# Altium schematic symbol library SparkFun.SCHLIB: 796 symbols (part 4 of 5)
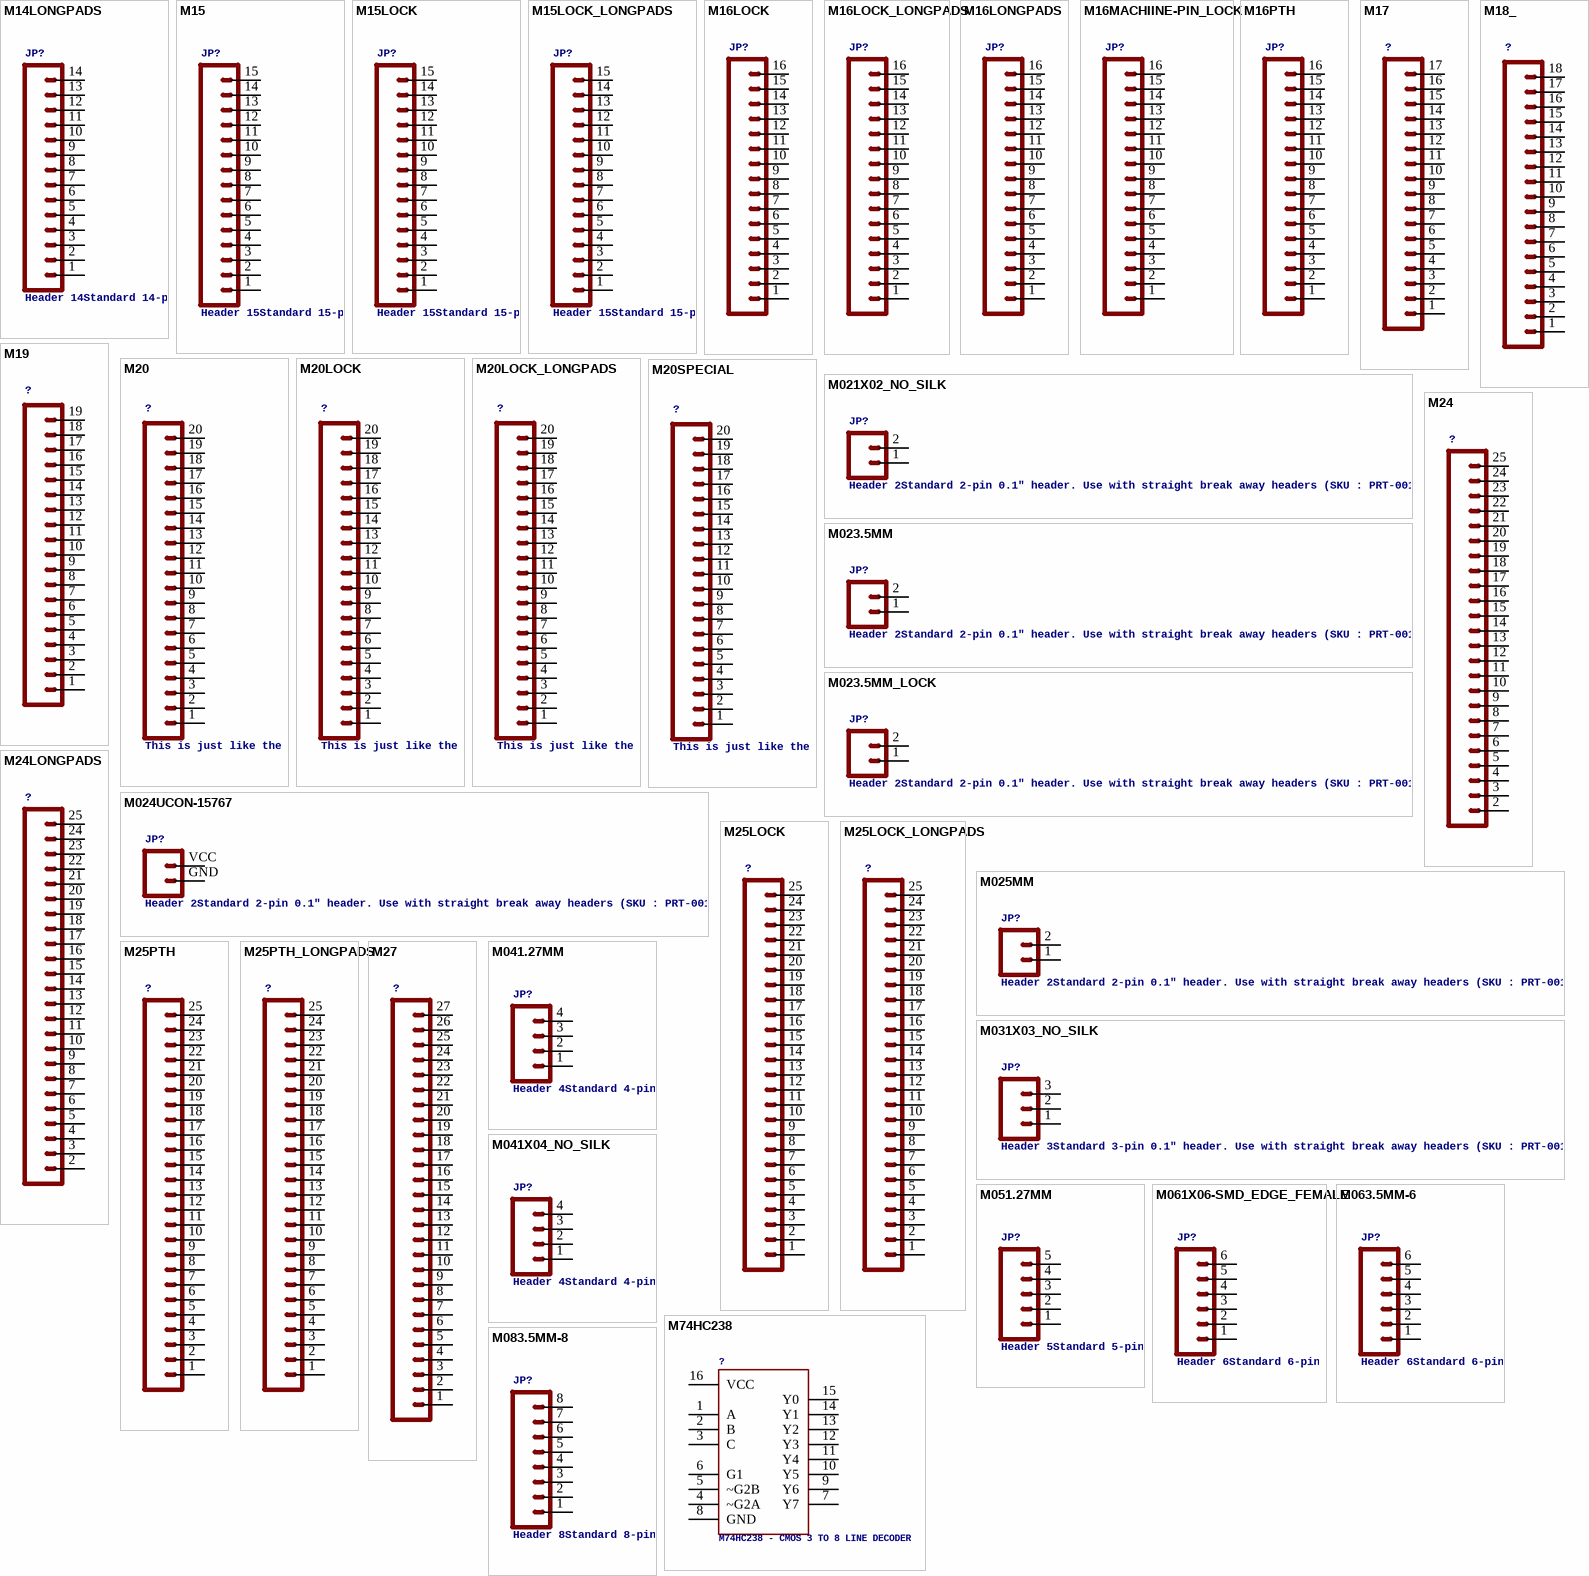
[diagram p39: symbols M14LONGPADS to M083.5MM-8]

## M025MM
designator JP?, comment Header 2Standard 2-pin 0.1" header. Use with straight break away headers (SKU : PRT-00116), right angle break away headers (PRT-00553), swiss pins (PRT-00743), machine pins (PRT-00117), and female headers (PRT-00115). Molex polarized connector foot print use with SKU : PRT-08233 with associated crimp pins and housings.
footprint SCREWTERMINAL-5MM-2
pins: 1, 2

## M25PTH
designator ?
footprint 1X25
pins: 1, 2, 3, 4, 5, 6, 7, 8, 9, 10, 11, 12, 13, 14, 15, 16, 17, 18, 19, 20, 21, 22, 23, 24, 25

## M25PTH_LONGPADS
designator ?
footprint 1X25_LONGPAD
pins: 1, 2, 3, 4, 5, 6, 7, 8, 9, 10, 11, 12, 13, 14, 15, 16, 17, 18, 19, 20, 21, 22, 23, 24, 25

## M27
designator ?
footprint 1X27
pins: 1, 2, 3, 4, 5, 6, 7, 8, 9, 10, 11, 12, 13, 14, 15, 16, 17, 18, 19, 20, 21, 22, 23, 24, 25, 26, 27

## M031X03_NO_SILK
designator JP?, comment Header 3Standard 3-pin 0.1" header. Use with straight break away headers (SKU : PRT-00116), right angle break away headers (PRT-00553), swiss pins (PRT-00743), machine pins (PRT-00117), and female headers (PRT-00115). Molex polarized connector foot print use with SKU : PRT-08232 with associated crimp pins and housings.
footprint 1X03_NO_SILK
pins: 1, 2, 3

## M041.27MM
designator JP?, comment Header 4Standard 4-pin 0.1" header. Use with straight break away headers (SKU : PRT-00116), right angle break away headers (PRT-00553), swiss pins (PRT-00743), machine pins (PRT-00117), and female headers (PRT-00115). Molex polarized connector foot print use with SKU : PRT-08231 with associated crimp pins and housings.
footprint 1X04-1.27MM
pins: 1, 2, 3, 4

## M041X04_NO_SILK
designator JP?, comment Header 4Standard 4-pin 0.1" header. Use with straight break away headers (SKU : PRT-00116), right angle break away headers (PRT-00553), swiss pins (PRT-00743), machine pins (PRT-00117), and female headers (PRT-00115). Molex polarized connector foot print use with SKU : PRT-08231 with associated crimp pins and housings.
footprint 1X04_NO_SILK
pins: 1, 2, 3, 4

## M051.27MM
designator JP?, comment Header 5Standard 5-pin 0.1" header. Use with straight break away headers (SKU : PRT-00116), right angle break away headers (PRT-00553), swiss pins (PRT-00743), machine pins (PRT-00117), and female headers (PRT-00115). Molex polarized connector foot print use with SKU : PRT-08230 with associated crimp pins and housings.
footprint 1X05-1.27MM
pins: 1, 2, 3, 4, 5

## M061X06-SMD_EDGE_FEMALE
designator JP?, comment Header 6Standard 6-pin 0.1" header. Use with straight break away headers (SKU : PRT-00116), right angle break away headers (PRT-00553), swiss pins (PRT-00743), machine pins (PRT-00117), and female headers (PRT-00115). Molex polarized connector foot print use with SKU : PRT-08094 with associated crimp pins and housings. NOTES ON THE VARIANTS LOCK and LOCK_LONGPADS... This footprint was designed to help hold the alignment of a through-hole component (i.e.  6-pin header) while soldering it into place. You may notice that each hole has been shifted either up or down by 0.005 of an inch from it's more standard position (which is a perfectly straight line). This slight alteration caused the pins (the squares in the middle) to touch the edges of the holes.  Because they are alternating, it causes a "brace" to hold the component in place.  0.005 has proven to be the perfect amount of "off-center" position when using our standard breakaway headers. Although looks a little odd when you look at the bare footprint, once you have a header in there, the alteration is very hard to notice.  Also, if you push a header all the way into place, it is covered up entirely on the bottom side.  This idea of altering the position of holes to aid alignment will be further integrated into the Sparkfun Library for other footprints.  It can help hold any component with 3 or more connection pins.
footprint 1X06-SMD_EDGE
pins: 1, 2, 3, 4, 5, 6

## M063.5MM-6
designator JP?, comment Header 6Standard 6-pin 0.1" header. Use with straight break away headers (SKU : PRT-00116), right angle break away headers (PRT-00553), swiss pins (PRT-00743), machine pins (PRT-00117), and female headers (PRT-00115). Molex polarized connector foot print use with SKU : PRT-08094 with associated crimp pins and housings. NOTES ON THE VARIANTS LOCK and LOCK_LONGPADS... This footprint was designed to help hold the alignment of a through-hole component (i.e.  6-pin header) while soldering it into place. You may notice that each hole has been shifted either up or down by 0.005 of an inch from it's more standard position (which is a perfectly straight line). This slight alteration caused the pins (the squares in the middle) to touch the edges of the holes.  Because they are alternating, it causes a "brace" to hold the component in place.  0.005 has proven to be the perfect amount of "off-center" position when using our standard breakaway headers. Although looks a little odd when you look at the bare footprint, once you have a header in there, the alteration is very hard to notice.  Also, if you push a header all the way into place, it is covered up entirely on the bottom side.  This idea of altering the position of holes to aid alignment will be further integrated into the Sparkfun Library for other footprints.  It can help hold any component with 3 or more connection pins.
footprint SCREWTERMINAL-3.5MM-6
pins: 1, 2, 3, 4, 5, 6

## M74HC238
designator ?, comment M74HC238 - CMOS 3 TO 8 LINE DECODER
footprint DIL16
pins: 1 A, 2 B, 3 C, 4 ~G2A, 5 ~G2B, 6 G1, 7 Y7, 8 GND, 9 Y6, 10 Y5, 11 Y4, 12 Y3, 13 Y2, 14 Y1, 15 Y0, 16 VCC

## M083.5MM-8
designator JP?, comment Header 8Standard 8-pin 0.1" header. Use with straight break away headers (SKU : PRT-00116), right angle break away headers (PRT-00553), swiss pins (PRT-00743), machine pins (PRT-00117), and female headers (PRT-00115).
footprint SCREWTERMINAL-3.5MM-8
pins: 1, 2, 3, 4, 5, 6, 7, 8

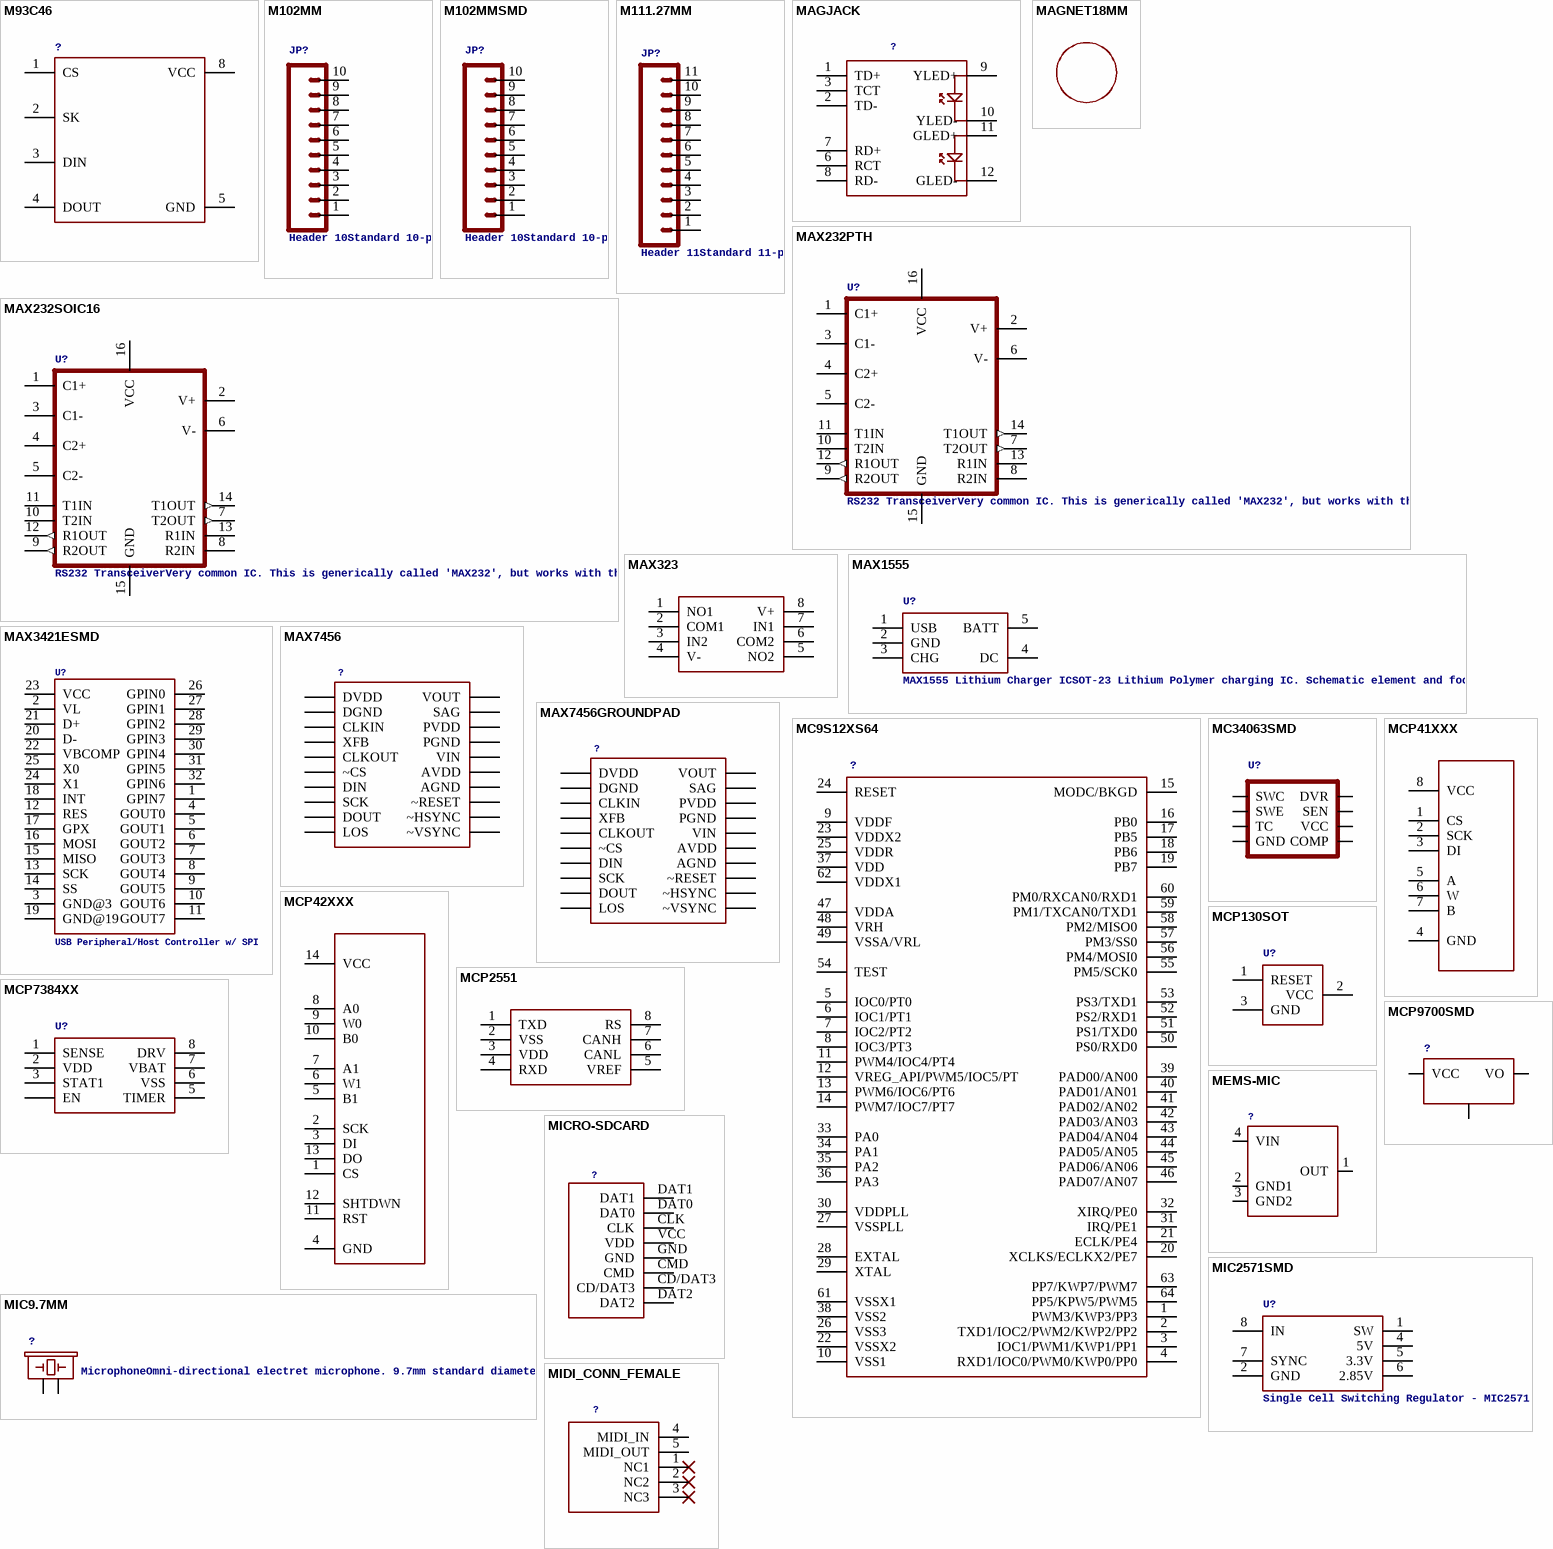
[diagram p24: symbols M93C46 to MIDI_CONN_FEMALE]

## M93C46
designator ?
footprint SO08
pins: 1 CS, 2 SK, 3 DIN, 4 DOUT, 5 GND, 8 VCC

## M102MM
designator JP?, comment Header 10Standard 10-pin 0.1" header. Use with straight break away headers (SKU : PRT-00116), right angle break away headers (PRT-00553), swiss pins (PRT-00743), machine pins (PRT-00117), and female headers (PRT-00115).
footprint 1X10-2MM
pins: 1, 2, 3, 4, 5, 6, 7, 8, 9, 10

## M102MMSMD
designator JP?, comment Header 10Standard 10-pin 0.1" header. Use with straight break away headers (SKU : PRT-00116), right angle break away headers (PRT-00553), swiss pins (PRT-00743), machine pins (PRT-00117), and female headers (PRT-00115).
footprint 1X10-2MM-SMD
pins: 1, 2, 3, 4, 5, 6, 7, 8, 9, 10

## M111.27MM
designator JP?, comment Header 11Standard 11-pin 0.1" header. Use with straight break away headers (SKU : PRT-00116), right angle break away headers (PRT-00553), swiss pins (PRT-00743), machine pins (PRT-00117), and female headers (PRT-00115).
footprint 1X11-1.27MM
pins: 1, 2, 3, 4, 5, 6, 7, 8, 9, 10, 11

## MAGJACK
designator ?
footprint MAGJACK
pins: 1 TD+, 2 TD-, 3 TCT, 6 RCT, 7 RD+, 8 RD-, 9 YLED+, 10 YLED-, 11 GLED+, 12 GLED-

## MAGNET18MM
designator ?
footprint MAGNET-18MM

## MAX232PTH
designator U?, comment RS232 TransceiverVery common IC. This is generically called 'MAX232', but works with the 3V equivalent MAX3232 generic ICs. Field tested and mother approved. Spark Fun Electronics SKU : COM-00316 (DIP) and COM-00589 (SMD)
footprint DIL16
pins: 1 C1+, 2 V+, 3 C1-, 4 C2+, 5 C2-, 6 V-, 7 T2OUT (out), 8 R2IN, 9 R2OUT (out), 10 T2IN, 11 T1IN, 12 R1OUT (out), 13 R1IN, 14 T1OUT (out), 15 GND, 16 VCC

## MAX232SOIC16
designator U?, comment RS232 TransceiverVery common IC. This is generically called 'MAX232', but works with the 3V equivalent MAX3232 generic ICs. Field tested and mother approved. Spark Fun Electronics SKU : COM-00316 (DIP) and COM-00589 (SMD)
footprint SO016
pins: 1 C1+, 2 V+, 3 C1-, 4 C2+, 5 C2-, 6 V-, 7 T2OUT (out), 8 R2IN, 9 R2OUT (out), 10 T2IN, 11 T1IN, 12 R1OUT (out), 13 R1IN, 14 T1OUT (out), 15 GND, 16 VCC

## MAX323
designator U?
footprint SO08
pins: 1 NO1, 2 COM1, 3 IN2, 4 V-, 5 NO2, 6 COM2, 7 IN1, 8 V+

## MAX1555
designator U?, comment MAX1555 Lithium Charger ICSOT-23 Lithium Polymer charging IC. Schematic element and footprint proven. Spark Fun Electronics SKU : COM-00674
footprint SOT23-5
pins: 1 USB, 2 GND, 3 CHG, 4 DC, 5 BATT

## MAX3421ESMD
designator U?, comment USB Peripheral/Host Controller w/ SPI
footprint TQFP32-5MM
pins: 1 GPIN7, 2 VL, 3 GND@3, 4 GOUT0, 5 GOUT1, 6 GOUT2, 7 GOUT3, 8 GOUT4, 9 GOUT5, 10 GOUT6, 11 GOUT7, 12 RES, 13 SCK, 14 SS, 15 MISO, 16 MOSI, 17 GPX, 18 INT, 19 GND@19, 20 D-, 21 D+, 22 VBCOMP, 23 VCC, 24 X1, 25 X0, 26 GPIN0, 27 GPIN1, 28 GPIN2, 29 GPIN3, 30 GPIN4, 31 GPIN5, 32 GPIN6

## MAX7456
designator ?
footprint TSSOP28
pins: 3 DVDD, 4 DGND, 5 CLKIN, 6 XFB, 7 CLKOUT, 8 ~CS, 9 DIN, 10 SCK, 11 DOUT, 12 LOS, 17 ~VSYNC, 18 ~HSYNC, 19 ~RESET, 20 AGND, 21 AVDD, 22 VIN, 23 PGND, 24 PVDD, 25 SAG, 26 VOUT

## MAX7456GROUNDPAD
designator ?
footprint TSSOP28-GROUNDPAD
pins: 3 DVDD, 4 DGND, 5 CLKIN, 6 XFB, 7 CLKOUT, 8 ~CS, 9 DIN, 10 SCK, 11 DOUT, 12 LOS, 17 ~VSYNC, 18 ~HSYNC, 19 ~RESET, 20 AGND, 21 AVDD, 22 VIN, 23 PGND, 24 PVDD, 25 SAG, 26 VOUT

## MC9S12XS64
designator ?
footprint SQFP-S-10X10-64
pins: 1 PWM3/KWP3/PP3, 2 TXD1/IOC2/PWM2/KWP2/PP2, 3 IOC1/PWM1/KWP1/PP1, 4 RXD1/IOC0/PWM0/KWP0/PP0, 5 IOC0/PT0, 6 IOC1/PT1, 7 IOC2/PT2, 8 IOC3/PT3, 9 VDDF, 10 VSS1, 11 PWM4/IOC4/PT4, 12 VREG_API/PWM5/IOC5/PT, 13 PWM6/IOC6/PT6, 14 PWM7/IOC7/PT7, 15 MODC/BKGD, 16 PB0, 17 PB5, 18 PB6, 19 PB7, 20 XCLKS/ECLKX2/PE7, 21 ECLK/PE4, 22 VSSX2, 23 VDDX2, 24 RESET, 25 VDDR, 26 VSS3, 27 VSSPLL, 28 EXTAL, 29 XTAL, 30 VDDPLL, 31 IRQ/PE1, 32 XIRQ/PE0, 33 PA0, 34 PA1, 35 PA2, 36 PA3, 37 VDD, 38 VSS2, 39 PAD00/AN00, 40 PAD01/AN01, 41 PAD02/AN02, 42 PAD03/AN03, 43 PAD04/AN04, 44 PAD05/AN05, 45 PAD06/AN06, 46 PAD07/AN07, 47 VDDA, 48 VRH, 49 VSSA/VRL, 50 PS0/RXD0, 51 PS1/TXD0, 52 PS2/RXD1, 53 PS3/TXD1, 54 TEST, 55 PM5/SCK0, 56 PM4/MOSI0, 57 PM3/SS0, 58 PM2/MISO0, 59 PM1/TXCAN0/TXD1, 60 PM0/RXCAN0/RXD1, 61 VSSX1, 62 VDDX1, 63 PP7/KWP7/PWM7, 64 PP5/KPW5/PWM5

## MC34063SMD
designator U?
footprint SO08
pins: 1 SWC, 2 SWE, 3 TC, 4 GND, 5 COMP, 6 VCC, 7 SEN, 8 DVR

## MCP41XXX
designator U?
footprint SO08
pins: 1 CS, 2 SCK, 3 DI, 4 GND, 5 A, 6 W, 7 B, 8 VCC

## MCP42XXX
designator U?
footprint SO014
pins: 1 CS, 2 SCK, 3 DI, 4 GND, 5 B1, 6 W1, 7 A1, 8 A0, 9 W0, 10 B0, 11 RST, 12 SHTDWN, 13 DO, 14 VCC

## MCP130SOT
designator U?
footprint SOT23-3
pins: 1 RESET, 2 VCC, 3 GND

## MCP2551
designator U?
footprint SO08
pins: 1 TXD, 2 VSS, 3 VDD, 4 RXD, 5 VREF, 6 CANL, 7 CANH, 8 RS

## MCP7384XX
designator U?
footprint MSOP8
pins: 1 SENSE, 2 VDD, 3 STAT1, 4 EN, 5 TIMER, 6 VSS, 7 VBAT, 8 DRV

## MCP9700SMD
designator ?
footprint SOT23-3
pins: 1 VCC, 2 VO, 3 GND

## MEMS-MIC
designator ?
footprint MEMS-MIC
pins: 1 OUT, 2 GND1, 3 GND2, 4 VIN

## MIC9.7MM
designator ?, comment MicrophoneOmni-directional electret microphone. 9.7mm standard diameter.
footprint MIC-9.7MM
pins: 1, 2

## MIC2571SMD
designator U?, comment Single Cell Switching Regulator - MIC2571
footprint MSOP-8
pins: 1 SW, 2 GND, 4 5V, 5 3.3V, 6 2.85V, 7 SYNC, 8 IN

## MICRO-SDCARD
designator ?
footprint MICRO-SDCARD
pins: CD/DAT3, CLK, CMD, DAT0, DAT1, DAT2, GND, VCC VDD

## MIDI_CONN_FEMALE
designator ?
footprint DIN_5_FEMALE
pins: 1 NC1, 2 NC2, 3 NC3, 4 MIDI_IN, 5 MIDI_OUT

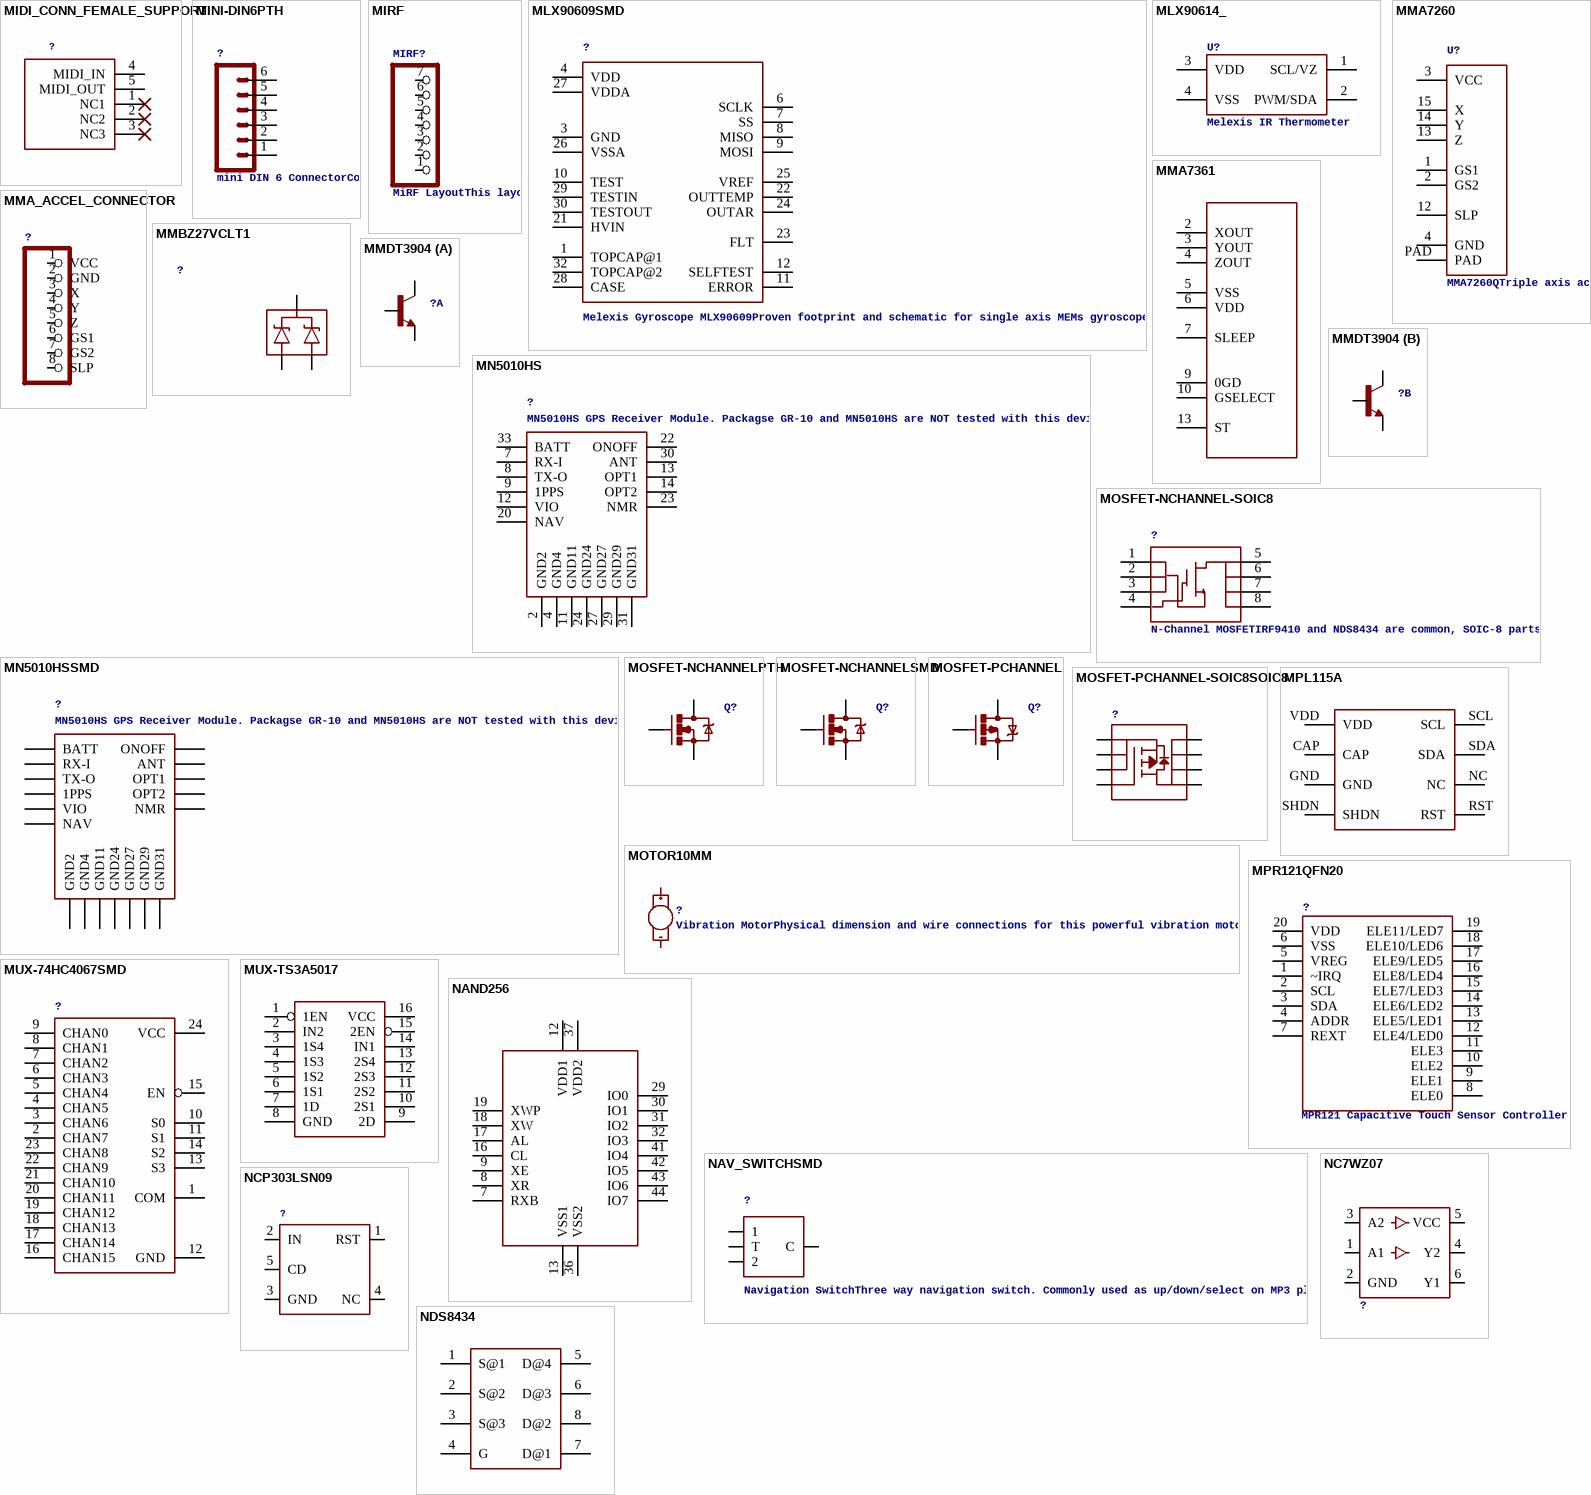
[diagram p25: symbols MIDI_CONN_FEMALE_SUPPORT to NDS8434]

## MIDI_CONN_FEMALE_SUPPORT
designator ?
footprint DIN_5_FEMALE_SUPPORT
pins: 1 NC1, 2 NC2, 3 NC3, 4 MIDI_IN, 5 MIDI_OUT

## MINI-DIN6PTH
designator ?, comment mini DIN 6 ConnectorCommonly found on the back of a computer for PS2 keyboard and mice. Schematic and footprint are proven. Spark Fun Electronics SKU : PRT-08509
footprint MINI-DIN6
pins: 1, 2, 3, 4, 5, 6

## MIRF
designator MIRF?, comment MiRF LayoutThis layout mates with the Spark Fun Electronics SKU : WRL-00153 transceiver.
footprint MIRF
pins: 1 7, 2 6, 3 5, 4, 5 3, 6 2, 7 1

## MLX90609SMD
designator ?, comment Melexis Gyroscope MLX90609Proven footprint and schematic for single axis MEMs gyroscope. Spark Fun Electronics SKU: COM-08336 and others
footprint MLX90609
pins: 1 TOPCAP@1, 3 GND, 4 VDD, 6 SCLK, 7 SS, 8 MISO, 9 MOSI, 10 TEST, 11 ERROR, 12 SELFTEST, 21 HVIN, 22 OUTTEMP, 23 FLT, 24 OUTAR, 25 VREF, 26 VSSA, 27 VDDA, 28 CASE, 29 TESTIN, 30 TESTOUT, 32 TOPCAP@2

## MLX90614_
designator U?, comment Melexis IR Thermometer
footprint TO-39
pins: 1 SCL/VZ, 2 PWM/SDA, 3 VDD, 4 VSS

## MMA7260
designator U?, comment MMA7260QTriple axis accelerometer from Freescale. Schematic element and footprint production proven. Center pad has reduced paste layer for solder short reduction. Spark Fun Electronics SKU : COM-00308
footprint MMA7260
pins: 1 GS1, 2 GS2, 3 VCC, 4 GND, 12 SLP, 13 Z, 14 Y, 15 X, PAD

## MMA7361
designator ?
footprint LGA14
pins: 2 XOUT, 3 YOUT, 4 ZOUT, 5 VSS, 6 VDD, 7 SLEEP, 9 0GD, 10 GSELECT, 13 ST

## MMA_ACCEL_CONNECTOR
designator ?
footprint 1X08
pins: 1 VCC, 2 GND, 3 X, 4 Y, 5 Z, 6 GS1, 7 GS2, 8 SLP

## MMBZ27VCLT1
designator ?
footprint SOT23-3
pins: 1 A1, 2 A2, 3 C

## MMDT3904
designator ?
footprint SOT363
part A pins: 3 C, 4 E, 5 B
part B pins: 1 E, 2 B, 6 C

## MN5010HS
designator ?, comment MN5010HS GPS Receiver Module. Packagse GR-10 and MN5010HS are NOT tested with this device.
footprint GR-10
pins: 2 GND2, 4 GND4, 7 RX-I, 8 TX-O, 9 1PPS, 11 GND11, 12 VIO, 13 OPT1, 14 OPT2, 20 NAV, 22 ONOFF, 23 NMR, 24 GND24, 27 GND27, 29 GND29, 30 ANT, 31 GND31, 33 BATT

## MN5010HSSMD
designator ?, comment MN5010HS GPS Receiver Module. Packagse GR-10 and MN5010HS are NOT tested with this device.
footprint MN5010HS
pins: ?1 1PPS, ?2 ANT, ?3 BATT, ?4 GND2, ?5 GND11, ?6 GND24, ?7 GND27, ?8 GND29, ?9 GND31, ?10 NAV, ?11 NMR, ?12 ONOFF, ?13 OPT1, ?14 OPT2, ?15 RX-I, ?16 TX-O, ?17 VIO, ?18 GND4

## MOSFET-NCHANNEL-SOIC8
designator ?, comment N-Channel MOSFETIRF9410 and NDS8434 are common, SOIC-8 parts.
footprint SO08
pins: 1 S@1, 2 S@2, 3 S@3, 4 G, 5 D@4, 6 D@3, 7 D@2, 8 D@1

## MOSFET-NCHANNELPTH
designator Q?
footprint TO-92
pins: 1 D, 2 S, 3 G

## MOSFET-NCHANNELSMD
designator Q?
footprint SOT23-3
pins: 1 G, 2 S, 3 D

## MOSFET-PCHANNEL
designator Q?
footprint SOT23
pins: 1 G, 2 S, 3 D

## MOSFET-PCHANNEL-SOIC8SOIC8
designator ?
footprint SO08
pins: 1 S@1, 2 S@2, 3 S@3, 4 G, 5 D@1, 6 D@2, 7 D@3, 8 D@4

## MOTOR10MM
designator ?, comment Vibration MotorPhysical dimension and wire connections for this powerful vibration motor. Motor has a self adhesive backing. Spark Fun Electronics SKU : ROB-08449
footprint VIBE-MOTOR-10MM
pins: +, -

## MPL115A
designator ?
footprint MPL115A
pins: CAP, GND, NC, RST, SCL, SDA, SHDN, VDD

## MPR121QFN20
designator ?, comment MPR121 Capacitive Touch Sensor Controller
footprint QFN-20-0.4MM
pins: 1 ~IRQ, 2 SCL, 3 SDA, 4 ADDR, 5 VREG, 6 VSS, 7 REXT, 8 ELE0, 9 ELE1, 10 ELE2, 11 ELE3, 12 ELE4/LED0, 13 ELE5/LED1, 14 ELE6/LED2, 15 ELE7/LED3, 16 ELE8/LED4, 17 ELE9/LED5, 18 ELE10/LED6, 19 ELE11/LED7, 20 VDD

## MUX-74HC4067SMD
designator ?
footprint SSOP24
pins: 1 COM, 2 CHAN7, 3 CHAN6, 4 CHAN5, 5 CHAN4, 6 CHAN3, 7 CHAN2, 8 CHAN1, 9 CHAN0, 10 S0, 11 S1, 12 GND, 13 S3, 14 S2, 15 EN, 16 CHAN15, 17 CHAN14, 18 CHAN13, 19 CHAN12, 20 CHAN11, 21 CHAN10, 22 CHAN9, 23 CHAN8, 24 VCC

## MUX-TS3A5017
designator ?
footprint SO16
pins: 1 1EN, 2 IN2, 3 1S4, 4 1S3, 5 1S2, 6 1S1, 7 1D, 8 GND, 9 2D, 10 2S1, 11 2S2, 12 2S3, 13 2S4, 14 IN1, 15 2EN, 16 VCC

## NAND256
designator ?
footprint TSOP48
pins: 7 RXB, 8 XR, 9 XE, 12 VDD1, 13 VSS1, 16 CL, 17 AL, 18 XW, 19 XWP, 29 IO0, 30 IO1, 31 IO2, 32 IO3, 36 VSS2, 37 VDD2, 41 IO4, 42 IO5, 43 IO6, 44 IO7

## NAV_SWITCHSMD
designator ?, comment Navigation SwitchThree way navigation switch. Commonly used as up/down/select on MP3 players. Schematic element and footprint production proven. Spark Fun Electronics SKU : COM-08184
footprint NAV_SWITCH
pins: 1, 2, C (power), T

## NC7WZ07
designator ?
footprint SC70-6
pins: 1 A1, 2 GND, 3 A2, 4 Y2, 5 VCC, 6 Y1

## NCP303LSN09
designator ?
footprint SOT23-5
pins: 1 RST, 2 IN, 3 GND, 4 NC, 5 CD

## NDS8434
designator ?
footprint SO08
pins: 1 S@1, 2 S@2, 3 S@3, 4 G, 5 D@4, 6 D@3, 7 D@1, 8 D@2
